# Altium footprint library SCT8-Board.PcbLib: 132 footprints (part 7 of 9)
Each footprint in its own frame and in the unit in brackets; x right, y up, seen from the top. Pads: shape width x height; smd on the part's side, far side on the other; paste and mask are expansions set on the pad; w line width, h text height; cw(c..) or ccw(c..) is an arc to the next point about the centre after c.
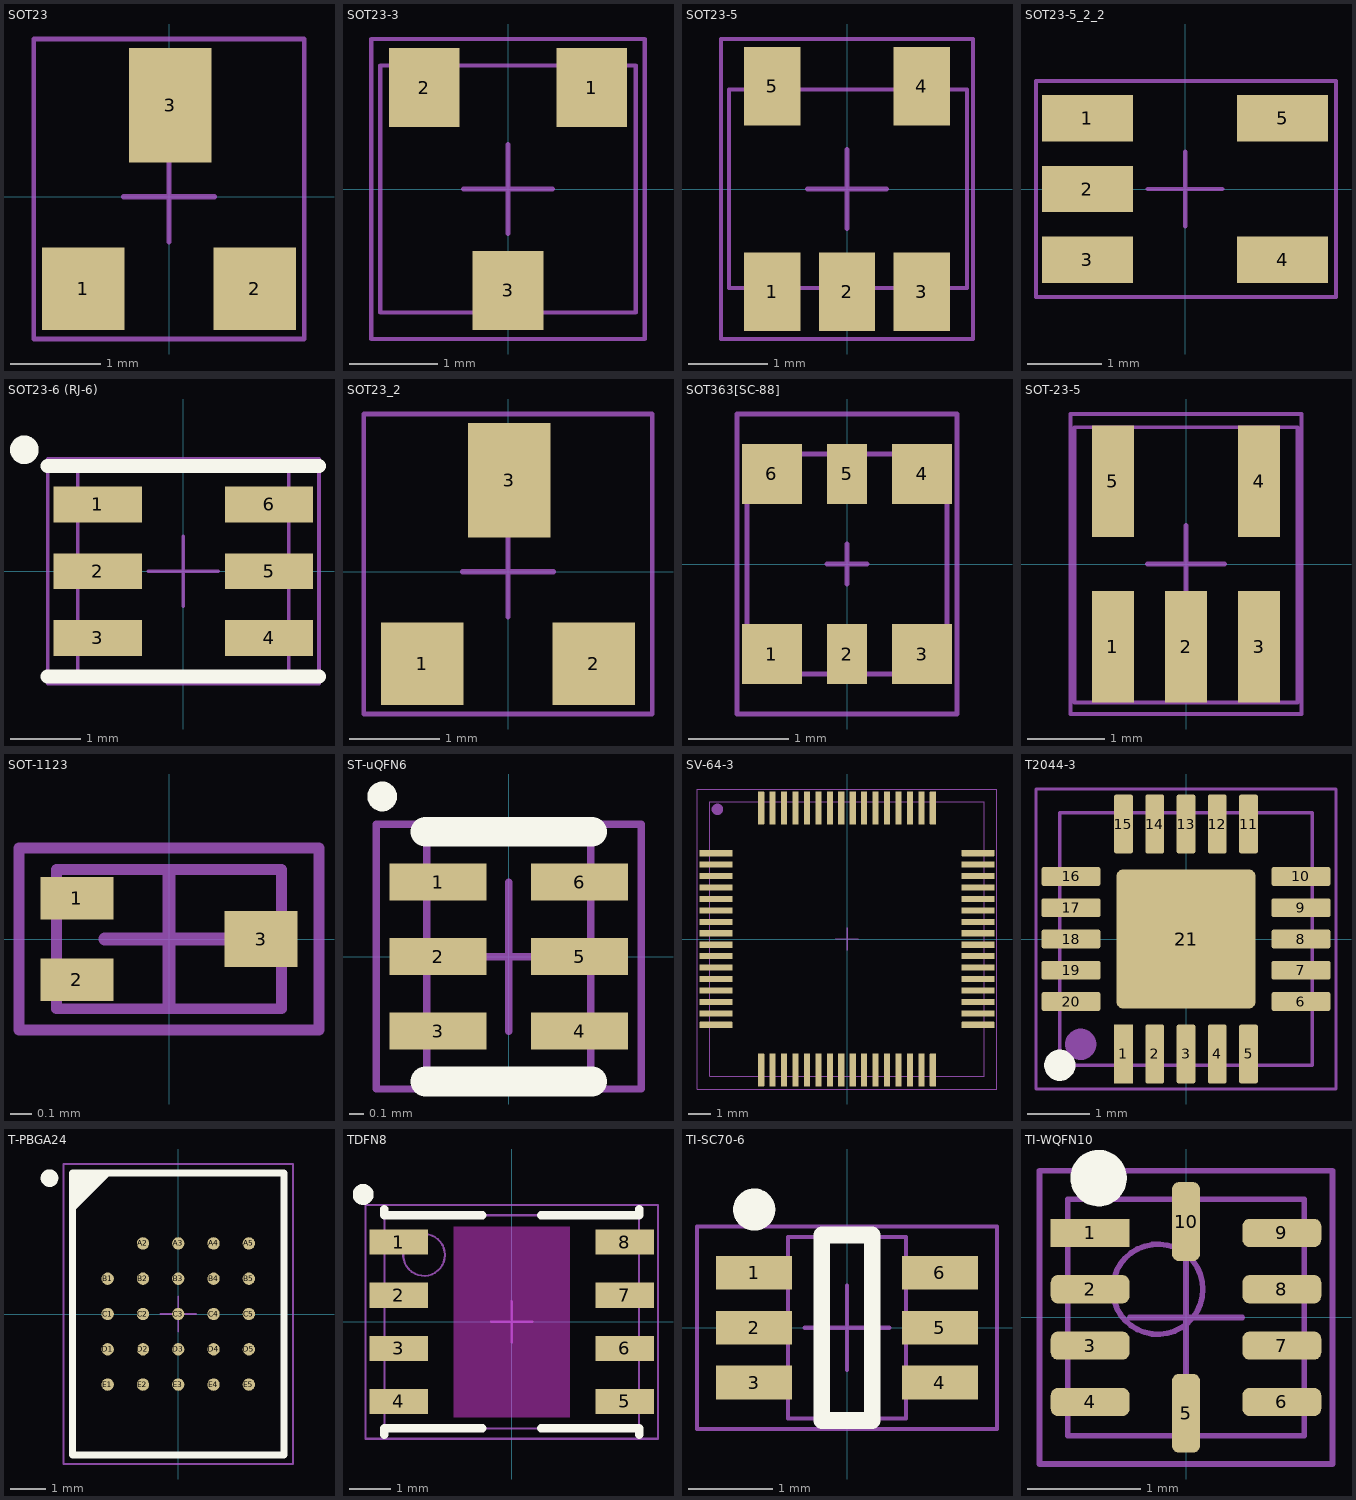
[diagram p6: the footprints below, top view; thin cyan lines are the x and y axes]

## SOT23 [mil]
pads (3):
  rect 36x36 smd: 1(-37.5,-40) 2(37.5,-40)
  rect 36x50 smd: 3(0.5,40)
Top Courtyard:
  lines w1.97: -59.06,-62.01 -59.06,68.9 59.06,68.9 59.06,-62.01 -59.06,-62.01
Top Designator:
  text ".Designator" at 3.11,-30.94 h13.78
Top Component Center:
  lines w2.36: -19.69,0 19.68,0 ; 0,-19.68 0,19.69
3D body: height 43.31, standoff 0, extent -59.06,-27.56 59.06,27.56

## SOT23-3 [mm]
pads (3):
  rect 0.8x0.9 smd mask+0.1: 1(0.95,1.15) 2(-0.95,1.15) 3(0,-1.15)
Top Courtyard:
  lines w0.05: -1.55,-1.7 -1.55,1.7 1.55,1.7 1.55,-1.7 -1.55,-1.7
Top Designator:
  text ".Designator" at 0.079,-0.786 h0.35
Top Component Center:
  lines w0.06: -0.5,0 0.5,0 ; 0,-0.5 0,0.5
Top Component Outline:
  lines w0.05: -1.45,-1.4 1.45,-1.4 1.45,1.4 -1.45,1.4 -1.45,-1.4
3D body "SOT23-3.step": height 1.3, standoff 0, extent -1.45,-1.4 1.45,1.4

## SOT23-5 [mil] "SOT 23 5 lead"
height 57
pads (5):
  rect 28x39 smd: 1(-37,-51) 2(0,-51) 3(37,-51) 4(37,51) 5(-37,51)
Top Courtyard:
  lines w1.97: -62.6,-74.44 62.6,-74.44 62.6,74.44 -62.6,74.44 -62.6,-74.44
Top Designator:
  text ".Designator" at 3.11,-30.94 h13.78
Top Component Center:
  lines w2.36: -19.69,0 19.68,0 ; 0,-19.68 0,19.69
Top Component Outline:
  lines w1.97: -58.65,-49.03 -58.65,49.39 59.46,49.39 59.46,-49.03 -58.65,-49.03
3D body "SOT23-5.step": height 41.65, standoff -1.65, extent -58.65,-49.03 59.46,49.4

## SOT23-5_2_2 [mm]
pads (5):
  rect 1.22x0.62 smd: 1(-1.31,0.95) 2(-1.31,0) 3(-1.31,-0.95) 4(1.31,-0.95) 5(1.31,0.95)
Top Courtyard:
  lines w0.05: -2,-1.45 2.025,-1.45 2.025,1.45 -2,1.45 -2,-1.45
Top Designator:
  text ".Designator" at -0.786,-0.079 h0.35
Top Component Center:
  lines w0.06: -0.5,0 0.5,0 ; 0,-0.5 0,0.5
3D body: height 1, standoff 0.1, extent -0.875,-1.45 0.875,1.45

## SOT23-6 (RJ-6) [mil]
pads (6):
  rect 49.56x20 smd: 1(-48,37.4) 2(-48,0) 3(-48,-37.4) 4(48,-37.4) 5(48,0) 6(48,37.4)
Top Overlay:
  circle w10: c-89,68 r3
  lines w7.87: -76,-59 76,-59 ; -76,59 76,59
Top Courtyard:
  lines w1.97: -76,-62.94 76,-62.94 76,62.96 -76,62.96 -76,-62.94
Top Designator:
  text ".Designator" at -30.94,-3.11 h13.78
Top Component Center:
  lines w1.97: -19.68,0 19.68,0 ; 0,-19.68 0,19.68
Top Component Outline:
  lines w1.97: -59.01,-59.01 -59.01,59.02 59.02,59.02 59.02,-59.01 -59.01,-59.01
3D body "RJ_6_ADI.step": height 57.09, standoff 0, extent -59.01,-59.01 59.02,59.02

## SOT23_2 [mil]
pads (3):
  rect 36x36 smd: 1(-37.5,-40) 2(37.5,-40)
  rect 36x50 smd: 3(0.5,40)
Top Designator:
  text ".Designator" at -30.94,-3.11 h13.78
Top 3D Body:
  lines w1.97: -62.99,-62.01 -62.99,68.9 62.99,68.9 62.99,-62.01 -62.99,-62.01
Top Component Center:
  lines w2.36: -19.69,0 19.68,0 ; 0,-19.68 0,19.69
3D body: height 43.31, standoff 0, extent -59.06,-27.56 59.06,27.56

## SOT363[SC-88] [mm] "SOT363 / SC-88 Reflow soldering footprint, 2x2.1 mm (WxH) incl. leads"
height 1.1
pads (6):
  rect 0.6x0.6 smd paste+0 mask+0.05: 1(-0.75,-0.9) 3(0.75,-0.9) 4(0.75,0.9) 6(-0.75,0.9)
  rect 0.4x0.6 smd paste+0 mask+0.05: 2(0,-0.9) 5(0,0.9)
Top Overlay:
  text "." at -0.65,-1.784 h1
Top Courtyard:
  lines w0.05: -1.1,-1.5 1.1,-1.5 1.1,1.5 -1.1,1.5 -1.1,-1.5
Top Designator:
  text ".Designator" at 0.102,-1.015 h0.45
Top Component Center:
  lines w0.05: -0.2,0 0.2,0 ; 0,-0.2 0,0.2
Top Component Outline:
  lines w0.05: -1,-1.1 1,-1.1 1,1.1 -1,1.1 -1,-1.1
3D body "SC88-6.step": height 1.1, standoff 0, extent -1,-1.1 1,1.1

## SOT-23-5 [mm] "SOT25, SOT753, MO-178AA, SC-74A, SMT5; 5 Leads; Pitch 0.95mm; Body 3.1 x 3 mm, inc. leads (LxW max)"
height 1.25
pads (5):
  rect 0.55x1.45 smd mask+0.1: 1(-0.95,-1.075) 2(0,-1.075) 3(0.95,-1.075)
  rect 0.55x1.45 smd: 4(0.95,1.075) 5(-0.95,1.075)
Top Courtyard:
  lines w0.05: -1.5,-1.95 -1.5,1.95 1.5,1.95 1.5,-1.95 -1.5,-1.95
Top Designator:
  text ".Designator" at 0.079,-0.786 h0.35
Top 3D Body:
  lines w0.05: -1.45,-1.8 1.45,-1.8 1.45,1.778 -1.45,1.778 -1.45,-1.8
Top Component Center:
  lines w0.06: -0.5,0 0.5,0 ; 0,-0.5 0,0.5
3D body "SOT23-5-2.STEP": height 1.45, standoff 0, extent -1.45,-1.4 1.45,1.4

## SOT-1123 [mm]
pads (3):
  rect 0.34x0.2 smd paste+0 mask+0.05: 1(-0.43,0.19) 2(-0.43,-0.19)
  rect 0.34x0.26 smd paste+0 mask+0.05: 3(0.43,0)
Top Solder:
  rectangle: -0.65,-0.041 -0.21,0.041
Top Courtyard:
  lines w0.05: -0.7,-0.425 0.7,-0.425 0.7,0.425 -0.7,0.425 -0.7,-0.425
Top Designator:
  text ".Designator" at -0.451,-0.045 h0.2
Top Component Center:
  lines w0.06: -0.3,0 0.3,0 ; 0,-0.3 0,0.3
Top Component Outline:
  lines w0.05: 0.525,-0.325 -0.525,-0.325 -0.525,0.325 0.525,0.325 ; 0.525,-0.325 0.525,-0.325 ; 0.525,-0.325 0.525,0.325 ; 0.525,0.325 0.525,0.325
3D body "SOT-1123.STEP": height 0.4, standoff 0, extent -0.525,-0.325 0.525,0.325

## ST-uQFN6 [mm]
height 0.6
pads (6):
  rect 0.65x0.25 smd: 1(-0.475,0.5) 2(-0.475,0) 3(-0.475,-0.5) 4(0.475,-0.5) 5(0.475,0) 6(0.475,0.5)
Top Overlay:
  circle w0.1: c-0.85,1.075 r0.05
  lines w0.2: -0.559,-0.838 0.559,-0.838 ; -0.559,0.838 0.559,0.838
Top Courtyard:
  lines w0.05: -0.889,-0.889 -0.889,0.889 0.889,0.889 0.889,-0.889 -0.889,-0.889
Top Designator:
  text ".Designator" at 0.068,-0.674 h0.3
Top Component Center:
  lines w0.05: -0.5,0 0.5,0 ; 0,-0.5 0,0.5
Top Component Outline:
  lines w0.05: -0.55,-0.775 -0.55,0.775 0.55,0.775 0.55,-0.775 -0.55,-0.775
3D body: height 0.6, standoff 0, extent -0.55,-0.775 0.55,0.775

## SV-64-3 [mm] "64-Lead Thin Quad Flat Package, TQFP with EP on top of the IC"
height 1.2
pads (64):
  rect 1.461x0.27 smd paste+0 mask+0.05: 1(-5.725,3.75)
  rrect25% 1.461x0.27 smd paste+0 mask+0.05: 2(-5.725,3.25) 3(-5.725,2.75) 4(-5.725,2.25) 5(-5.725,1.75) 6(-5.725,1.25) 7(-5.725,0.75) 8(-5.725,0.25) 9(-5.725,-0.25) 10(-5.725,-0.75) 11(-5.725,-1.25) 12(-5.725,-1.75) 13(-5.725,-2.25) 14(-5.725,-2.75) 15(-5.725,-3.25) 16(-5.725,-3.75) 33(5.725,-3.75) 34(5.725,-3.25) 35(5.725,-2.75) 36(5.725,-2.25) 37(5.725,-1.75) 38(5.725,-1.25) 39(5.725,-0.75) 40(5.725,-0.25) 41(5.725,0.25) 42(5.725,0.75) 43(5.725,1.25) 44(5.725,1.75) 45(5.725,2.25) 46(5.725,2.75) 47(5.725,3.25) 48(5.725,3.75)
  rrect25% 0.27x1.461 smd paste+0 mask+0.05: 17(-3.75,-5.725) 18(-3.25,-5.725) 19(-2.75,-5.725) 20(-2.25,-5.725) 21(-1.75,-5.725) 22(-1.25,-5.725) 23(-0.75,-5.725) 24(-0.25,-5.725) 25(0.25,-5.725) 26(0.75,-5.725) 27(1.25,-5.725) 28(1.75,-5.725) 29(2.25,-5.725) 30(2.75,-5.725) 31(3.25,-5.725) 32(3.75,-5.725) 49(3.75,5.725) 50(3.25,5.725) 51(2.75,5.725) 52(2.25,5.725) 53(1.75,5.725) 54(1.25,5.725) 55(0.75,5.725) 56(0.25,5.725) 57(-0.25,5.725) 58(-0.75,5.725) 59(-1.25,5.725) 60(-1.75,5.725) 61(-2.25,5.725) 62(-2.75,5.725) 63(-3.25,5.725) 64(-3.75,5.725)
Top Overlay:
  text "." at -5.6,5.3 h1
Top Courtyard:
  lines w0.05: -6.556,-6.556 -6.556,6.556 6.556,6.556 6.556,-6.556 -6.556,-6.556
Top Designator:
  text ".Designator" at -1.912,-0.192 h0.85
Top Component Center:
  lines w0.06: -0.5,0 0.5,0 ; 0,-0.5 0,0.5
Top Component Outline:
  circle w0.3: c-5.665,5.665 r0.1
  lines w0.05: -6,-6 -6,6 6,6 6,-6 -6,-6
3D body "SV-64-3.STEP": height 1.31, standoff 0, extent -6,-6 6,6

## T2044-3 [mm] "20-Pin TQFN Package (4mm x 4mm)"
pads (21):
  rect 0.3x0.95 smd paste+0 mask+0.05: 1(-1,-1.84)
  rrect25% 0.3x0.95 smd paste+0 mask+0.05: 2(-0.5,-1.84) 3(0,-1.84) 4(0.5,-1.84) 5(1,-1.84) 11(1,1.84) 12(0.5,1.84) 13(0,1.84) 14(-0.5,1.84) 15(-1,1.84)
  rrect25% 0.95x0.3 smd paste+0 mask+0.05: 6(1.84,-1) 7(1.84,-0.5) 8(1.84,0) 9(1.84,0.5) 10(1.84,1) 16(-1.84,1) 17(-1.84,0.5) 18(-1.84,0) 19(-1.84,-0.5) 20(-1.84,-1)
  rrect10% 2.23x2.23 smd paste+0 mask+0.05: 21(0,0)
Top Overlay:
  circle w0.25: c-2.02,-2.02 r0.125
Top Courtyard:
  lines w0.05: -0.2,0 0.2,0 ; 0,-0.2 0,0.2 ; -2.4,-2.4 2.4,-2.4 2.4,2.4 -2.4,2.4 -2.4,-2.4
Top Designator:
  text ".Designator" at -1.689,-0.17 h0.75
Top Component Center:
  lines w0.06: -0.5,0 0.5,0 ; 0,-0.5 0,0.5
Top Component Outline:
  circle w0.3: c-1.685,-1.685 r0.1
  lines w0.05: -2.02,-2.02 2.02,-2.02 2.02,2.02 -2.02,2.02 -2.02,-2.02
3D body "T2044-3.STEP": height 0.77, standoff 0, extent -2.02,-2.02 2.02,2.02

## T-PBGA24 [mm] "BGA100P9X9-81A"
height 1.2
pads (24):
  round 0.35 smd: A2(-1,2) A3(0,2) A4(1,2) A5(2,2) B1(-2,1) B2(-1,1) B3(0,1) B4(1,1) B5(2,1) C1(-2,0) C2(-1,0) C3(0,0) C4(1,0) C5(2,0) D1(-2,-1) D2(-1,-1) D3(0,-1) D4(1,-1) D5(2,-1) E1(-2,-2) E2(-1,-2) E3(0,-2) E4(1,-2) E5(2,-2)
Top Overlay:
  circle w0.25: c-3.65,3.85 r0.125
  region: -2,4 -3,3 -3,4
  lines w0.2: -3,3 -2,4 ; -3,-4 3,-4 3,4 -3,4 -3,-4
Top Courtyard:
  lines w0.05: -3.25,-4.25 3.25,-4.25 3.25,4.25 -3.25,4.25 -3.25,-4.25
Top Designator:
  text ".Designator" at -1.912,-0.192 h0.85
Top Component Center:
  lines w0.05: -0.5,0 0.5,0 ; 0,-0.5 0,0.5
Top Component Outline:
  circle w0.254: c-2.625,3.625 r0.127
  lines w0.05: -3,-4 -3,4 3,4 3,-4 -3,-4
3D body: height 1.2, standoff 0.2, extent -3,-4 3,4

## TDFN8 [mm]
height 0.8
pads (8):
  rect 1.4x0.6 smd: 1(-2.7,1.905) 2(-2.7,0.635) 3(-2.7,-0.635) 4(-2.7,-1.905) 5(2.7,-1.905) 6(2.7,-0.635) 7(2.7,0.635) 8(2.7,1.905)
Top Layer keep-out:
  rectangle: -1.4,-2.286 1.394,2.286
Top Overlay:
  circle w0.25: c-3.556,3.048 r0.125
  lines w0.2: -3.05,-2.7 -3.05,-2.55 -0.7,-2.55 ; -3.05,2.7 -3.05,2.55 -0.7,2.55 ; 0.7,-2.55 3.05,-2.55 3.05,-2.7 ; 0.7,2.55 3.05,2.55 3.05,2.7
Top Courtyard:
  lines w0.05: -3.5,-2.8 3.5,-2.8 3.5,2.8 -3.5,2.8 -3.5,-2.8
Top Designator:
  text ".Designator" at -1.912,-0.192 h0.85
Top Component Center:
  lines w0.05: -0.5,0 0.5,0 ; 0,-0.5 0,0.5
Top Component Outline:
  circle w0.05: c-2.1,1.6 r0.5
  lines w0.05: -3.05,-2.55 -3.05,2.55 3.05,2.55 3.05,-2.55 -3.05,-2.55
3D body: height 0.8, standoff 0, extent -3.05,-2.55 3.05,2.55

## TI-SC70-6 [mm] "SC70, 6-Leads, Body 2.00x2.10mm, Pitch 0.65mm, IPC High Density"
height 1.1
pads (6):
  rect 0.9x0.4 smd: 1(-1.1,0.65) 2(-1.1,0) 3(-1.1,-0.65) 4(1.1,-0.65) 5(1.1,0) 6(1.1,0.65)
Top Overlay:
  circle w0.25: c-1.1,1.4 r0.125
  lines w0.2: -0.3,-1.1 -0.3,1.1 0.3,1.1 0.3,-1.1 -0.3,-1.1
Top Courtyard:
  lines w0.05: -1.778,-1.2 -1.778,1.2 1.778,1.2 1.778,-1.2 -1.778,-1.2
Top Designator:
  text ".Designator" at 0.09,-0.897 h0.4
Top Component Center:
  lines w0.05: -0.5,0 0.5,0 ; 0,-0.5 0,0.5
Top Component Outline:
  lines w0.05: -0.7,-1.075 0.7,-1.075 0.7,1.075 -0.7,1.075 -0.7,-1.075
3D body: height 1.1, standoff 0, extent -0.7,-1.075 0.7,1.075

## TI-WQFN10 [mm] "QFN, 10-Leads, Body 2.00x2.00mm, Pitch 0.50mm, IPC High Density"
height 0.8
pads (10):
  rect 0.7x0.25 smd paste+0 mask+0.05: 1(-0.85,0.75)
  rrect50% 0.7x0.25 smd paste+0 mask+0.05: 2(-0.85,0.25) 3(-0.85,-0.25) 4(-0.85,-0.75) 6(0.85,-0.75) 7(0.85,-0.25) 8(0.85,0.25) 9(0.85,0.75)
  rrect50% 0.25x0.7 smd paste+0 mask+0.05: 5(0,-0.85) 10(0,0.85)
Top Overlay:
  circle w0.25: c-0.775,1.236 r0.125
Top Courtyard:
  lines w0.05: -1.3,-1.3 -1.3,1.3 1.3,1.3 1.3,-1.3 -1.3,-1.3
Top Designator:
  text ".Designator" at -0.897,-0.09 h0.4
Top Component Center:
  lines w0.05: -0.5,0 0.5,0 ; 0,-0.5 0,0.5
Top Component Outline:
  circle w0.05: c-0.25,0.25 r0.4
  lines w0.05: -1.05,-1.05 1.05,-1.05 1.05,1.05 -1.05,1.05 -1.05,-1.05
3D body: height 0.8, standoff 0, extent -1.05,-1.05 1.05,1.05